# Altium footprint library MyPcbLib.PcbLib: 657 footprints (part 11 of 42)
Each footprint in its own frame and in the unit in brackets; x right, y up, seen from the top. Pads: shape width x height; smd on the part's side, far side on the other; paste and mask are expansions set on the pad; w line width, h text height; cw(c..) or ccw(c..) is an arc to the next point about the centre after c.
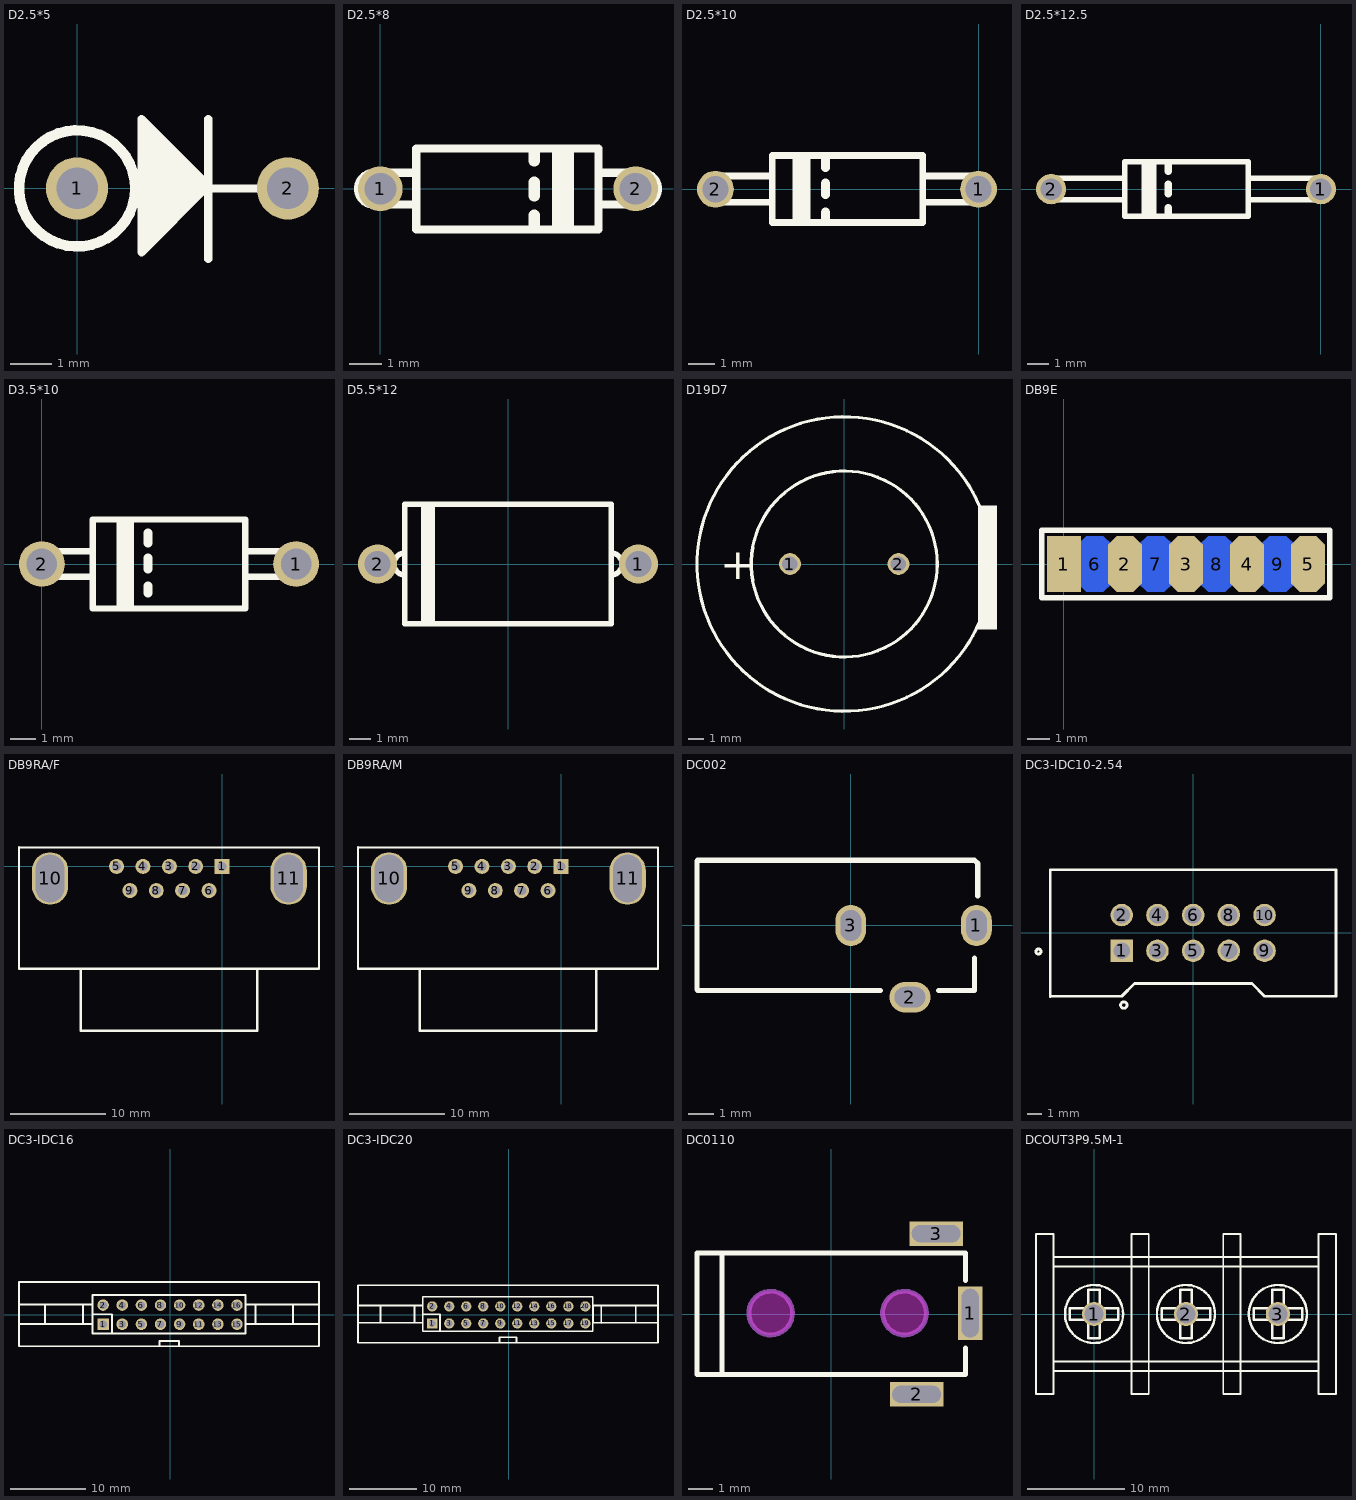
[diagram p10: the footprints below, top view; thin cyan lines are the x and y axes]

## D2.5*5 [mm]
pads (2):
  round 1.5 / inner round 1.5 / far side round 2 hole 1: 1(0,0) 2(5.08,0)
Top Overlay:
  circle w0.254: c0,0 r1.4
  lines w0.1: 1.553,-1.4 1.694,-1.4 ; 1.553,-1.3 1.794,-1.3 ; 1.553,-1.2 1.894,-1.2 ; 1.553,-1.1 1.994,-1.1 ; 1.553,-1 2.094,-1 ; 1.553,-0.9 2.194,-0.9 ; 1.553,-0.8 2.294,-0.8 ; 1.553,-0.7 2.394,-0.7 ; 1.553,-0.6 2.494,-0.6 ; 1.553,-0.5 2.594,-0.5 ; 1.553,-0.4 2.694,-0.4 ; 1.553,-0.3 2.794,-0.3 ; 1.553,-0.2 2.894,-0.2 ; 1.553,-0.1 2.994,-0.1 ; 1.553,0 3.094,0 ; 1.553,0.1 3.126,0.1 ; 1.553,0.2 3.026,0.2 ; 1.553,0.3 2.926,0.3 ; 1.553,0.4 2.826,0.4 ; 1.553,0.5 2.726,0.5 ; 1.553,0.6 2.626,0.6 ; 1.553,0.7 2.526,0.7 ; 1.553,0.8 2.426,0.8 ; 1.553,0.9 2.326,0.9 ; 1.553,1 2.226,1 ; 1.553,1.1 2.126,1.1 ; 1.553,1.2 2.026,1.2 ; 1.553,1.3 1.926,1.3 ; 1.553,1.4 1.826,1.4 ; 1.553,1.5 1.726,1.5 ; 1.572,-1.522 1.572,1.655 ; 1.672,-1.422 1.672,1.555 ; 1.772,-1.322 1.772,1.455 ; 1.872,-1.222 1.872,1.355 ; 1.972,-1.122 1.972,1.255 ; 2.072,-1.022 2.072,1.155 ; 2.172,-0.922 2.172,1.055 ; 2.272,-0.822 2.272,0.955 ; 2.372,-0.722 2.372,0.855 ; 2.472,-0.622 2.472,0.755 ; 2.572,-0.522 2.572,0.655 ; 2.672,-0.422 2.672,0.555 ; 2.772,-0.322 2.772,0.455 ; 2.872,-0.222 2.872,0.355 ; 2.972,-0.122 2.972,0.255 ; 3.072,-0.022 3.072,0.155 ; 1.553,-1.541 1.553,1.673 3.16,0.066 1.553,-1.541
  lines w0.2: 3.16,-1.702 3.16,1.673 ; 3.272,0 5.08,0 ; 1.553,-1.541 3.16,0.066 1.553,1.673 1.553,-1.541
  lines w1: 2.1,-0.327 2.1,0.423

## D2.5*8 [mm]
pads (2):
  round 1.4 / inner round 1.4 / far side round 2 hole 1: 1(0,0) 2(8,0)
Top Overlay:
  lines w0.25: 5.503,1.142 5.503,-1.158 5.943,-1.158 5.943,1.142 ; 5.633,-1.058 5.633,1.122 ; 5.803,-1.128 5.803,1.202
  lines w0.254: 1.093,-0.5 -0.2,-0.5 cw(c-0.2,0) -0.2,0.5 1.125,0.5 ; 6.84,-0.5 8.2,-0.5 ccw(c8.2,0) 8.2,0.5 6.84,0.5 ; 1.125,-1.278 6.84,-1.278 6.84,1.262 1.125,1.262 1.125,-1.278
  lines w0.35: 4.822,-1.228 4.822,-0.828 ; 4.822,-0.228 4.822,0.202 ; 4.822,0.872 4.822,1.152

## D2.5*10 [mm]
pads (2):
  round 1.4 / inner round 1.4 / far side round 2 hole 1: 1(0,0) 2(-10,0)
Top Overlay:
  lines w0.25: -6.943,-1.142 -6.943,1.158 -6.503,1.158 -6.503,-1.142 ; -6.803,-1.202 -6.803,1.128 ; -6.632,-1.122 -6.632,1.058
  lines w0.254: -7.84,-0.5 -10,-0.5 cw(c-10,0) -10,0.5 -7.84,0.5 ; -2.125,-0.5 0,-0.5 ccw(c0,0) 0,0.5 -2.093,0.5 ; -7.84,-1.262 -7.84,1.278 -2.125,1.278 -2.125,-1.262 -7.84,-1.262
  lines w0.35: -5.822,-1.152 -5.822,-0.872 ; -5.822,-0.202 -5.822,0.228 ; -5.822,0.828 -5.822,1.228

## D2.5*12.5 [mm]
pads (2):
  round 1.4 / inner round 1.4 / far side round 2 hole 1: 1(0,0) 2(-12.5,0)
Top Overlay:
  lines w0.25: -8.193,-1.142 -8.193,1.158 -7.753,1.158 -7.753,-1.142 ; -8.053,-1.202 -8.053,1.128 ; -7.883,-1.122 -7.883,1.058
  lines w0.254: -9.09,-0.5 -12.5,-0.5 cw(c-12.5,0) -12.5,0.5 -9.09,0.5 ; -3.375,-0.5 0,-0.5 ccw(c0,0) 0,0.5 -3.343,0.5 ; -9.09,-1.262 -9.09,1.278 -3.375,1.278 -3.375,-1.262 -9.09,-1.262
  lines w0.35: -7.073,-1.152 -7.073,-0.872 ; -7.073,-0.202 -7.073,0.228 ; -7.073,0.828 -7.073,1.228

## D3.5*10 [mm]
pads (2):
  round 1.8 hole 1.2: 1(10,0) 2(0,0)
Top Overlay:
  rectangle: 3,-1.75 3.625,1.75
  lines w0.25: 3.057,-1.693 3.057,-0.875 ; 3.057,-1.142 3.057,1.158 ; 3.057,1.693 3.057,1.158 ; 3.197,-1.202 3.197,1.128 ; 3.367,-1.122 3.367,1.058 ; 3.497,-1.142 3.497,1.158 3.057,1.158
  lines w0.254: 2,-0.5 0,-0.5 cw(c0,0) 0,0.5 2,0.5 ; 8,-0.5 10,-0.5 ccw(c10,0) 10,0.5 8,0.5 ; 2,-1.75 2,1.75 8,1.75 8,-1.75 2,-1.75
  lines w0.35: 4.177,-1.152 4.177,-0.872 ; 4.177,-0.202 4.177,0.228 ; 4.177,0.828 4.177,1.228

## D5.5*12 [mm]
pads (2):
  round 1.8 hole 1.2: 1(6,0) 2(-6,0)
Top Overlay:
  rectangle: -4.013,-2.75 -3.353,2.743
  lines w0.254: -4.75,-0.5 cw(c-4.75,0) -4.75,0.5 ; 4.75,-0.5 ccw(c4.75,0) 4.75,0.5 ; -4.75,-2.75 4.75,-2.75 4.75,2.75 -4.75,2.75 -4.75,-2.75

## D19D7 [mm]
pads (2):
  round 1.4 / inner round 1.4 / far side round 2 hole 1: 1(-3.5,0) 2(3.5,0)
Top Overlay:
  circle w0.203: c0,0 r6
  circle w0.203: c0,0 r9.5
  rectangle: 8.636,-4.216 9.855,3.759
  text "+" at -8,-1 h2

## DB9E [mil]
pads (9):
  rect 60x100 smd: 1(0,0)
  oct 60x100 smd: 2(109,0) 3(218,0) 4(327,0) 5(436,0)
  oct 60x100 smd far side: 6(55,0) 7(164,0) 8(273,0) 9(382,0)
Top Overlay:
  lines w10: -40,-60 475,-60 475,60 -40,60 -40,-60

## DB9RA/F [mil]
pads (11):
  rect 62x62 hole 38: 1(0,0)
  round 62 hole 38: 2(-109,0) 3(-218,0) 4(-327,0) 5(-436,0) 6(-54,-100) 7(-163,-100) 8(-272,-100) 9(-381,-100)
  oval 150x216.54 hole 118.11 slot 196.85 at 90 deg: 10(-711,-50) 11(275,-50)
Top Overlay:
  lines w8: -839.54,78.74 400.61,78.74 400.61,-423.23
  lines w10: -839.54,78.74 -839.54,-423.23 400.61,-423.23 ; -583.64,-425 -583.64,-679.13 144.71,-679.13 144.71,-425
3D body: height 126.51, standoff -507.87, extent -829.27,-658.6 387.27,54

## DB9RA/M [mil]
pads (11):
  rect 62x62 hole 38: 1(0,0)
  round 62 hole 38: 2(-109,0) 3(-218,0) 4(-327,0) 5(-436,0) 6(-54,-100) 7(-163,-100) 8(-272,-100) 9(-381,-100)
  oval 150x216.54 hole 118.11 slot 196.85 at 90 deg: 10(-711,-50) 11(275,-50)
Top Overlay:
  lines w8: -839.54,78.74 400.61,78.74 400.61,-423.23
  lines w10: -839.54,78.74 -839.54,-423.23 400.61,-423.23 ; -583.64,-425 -583.64,-679.13 144.71,-679.13 144.71,-425
3D body: height 492.13, standoff -142.26, extent -828.69,-651.41 387.84,57.25

## DC002 [mm]
pads (3):
  oval 1.2x1.6 hole 0.8 slot 1.2 at 90 deg: 1(4.9,0) 3(0,0)
  oval 1.6x1.2 hole 0.8 slot 1.2 at 0 deg: 2(2.306,-2.8)
Top Overlay:
  lines w0.203: -6,-2.5 -6,2.5 ; -5.969,-2.54 1.143,-2.54 ; -5.969,2.54 4.826,2.54 4.953,2.413 4.953,1.651 4.953,1.143 ; 3.429,-2.54 4.826,-2.54 4.826,-1.27
3D body: height 7.5, standoff 0, extent -6.071,-2.525 4.929,2.475

## DC3-IDC10-2.54 [mm]
pads (10):
  rect 1.6x1.6 hole 1.2: 1(-5.08,-1.27)
  round 1.6 hole 1.2: 2(-5.08,1.27) 3(-2.54,-1.27) 4(-2.54,1.27) 5(0,-1.27) 6(0,1.27) 7(2.54,-1.27) 8(2.54,1.27) 9(5.08,-1.27) 10(5.08,1.27)
Top Overlay:
  circle w0.203: c-10.998,-1.321 r0.18
  circle w0.203: c-4.928,-5.131 r0.23
  lines w0.203: -10.16,-4.521 -10.16,4.47 ; -10.15,-4.5 -5.075,-4.5 -4.182,-3.607 4.182,-3.607 5.075,-4.5 10.15,-4.5 ; -10.15,4.5 10.15,4.5 ; 10.16,-4.496 10.16,4.47
3D body: height 9.3, standoff -3.1, extent -10.099,-4.273 10.201,4.827

## DC3-IDC16 [mil]
pads (16):
  rect 60x60 hole 40: 1(-350,-50)
  round 60 hole 40: 2(-350,50) 3(-250,-50) 4(-250,50) 5(-150,-50) 6(-150,50) 7(-50,-50) 8(-50,50) 9(50,-50) 10(50,50) 11(150,-50) 12(150,50) 13(250,-50) 14(250,50) 15(350,-50) 16(350,50)
Top Overlay:
  lines w10: -790,54 -406,54 ; -789,-48 -408,-48 ; -789,140 -789,171 779,171 779,-165 -80,-165 46,-165 46,-137 -56,-137 -56,-165 -789,-165 -789,172 ; -653,-48 -653,50 ; -455,-48 -455,53 ; -406,62 -406,103 395,103 395,-99 -406,-99 -406,98 ; -402,2 -304,2 -304,-97 ; 397,54 779,54 ; 400,-48 779,-48 ; 446,-44 446,53 ; 643,-48 643,53

## DC3-IDC20 [mil]
pads (20):
  rect 60x60 hole 40: 1(-450,-50)
  round 60 hole 40: 2(-450,50) 3(-350,-50) 4(-350,50) 5(-250,-50) 6(-250,50) 7(-150,-50) 8(-150,50) 9(-50,-50) 10(-50,50) 11(50,-50) 12(50,50) 13(150,-50) 14(150,50) 15(250,-50) 16(250,50) 17(350,-50) 18(350,50) 19(450,-50) 20(450,50)
Top Overlay:
  lines w10: -885,-46 -508,-46 ; -883,56 -509,56 ; -754,-42 -754,52 ; -554,-41 -554,55 ; -504,4 -404,4 -404,-93 ; -54,-161 -54,-131 46,-131 46,-161 ; 494,34 494,106 -506,106 -506,-96 494,-96 494,103 ; 544,-47 544,53 ; 746,-45 746,55 ; 874,-46 497,-46 497,56 877,56 877,174 -886,174 -886,-163 877,-163 877,144

## DC0110 [mm]
pads (3):
  rect 1x2.2 hole 0.7 slot 2 at 90 deg: 1(5.714,0.036)
  rect 2.2x1 hole 0.7 slot 2 at 0 deg: 2(3.514,-3.3) 3(4.314,3.3)
Top Overlay:
  lines w0.203: -5.512,2.511 -5.512,-2.489 5.488,-2.489 ; -5.488,2.515 5.512,2.515 ; -4.482,-2.489 -4.482,2.511 ; 5.512,-2.485 5.512,-1.397 ; 5.512,1.375 5.512,2.464
Keep-Out Layer:
  board cut-out: 2.106,0.036 2.137,-0.199 2.227,-0.418 2.372,-0.606 2.56,-0.75 2.779,-0.841 3.014,-0.872 3.249,-0.841 3.467,-0.75 3.655,-0.606 3.8,-0.418 3.89,-0.199 3.921,0.036 3.89,0.271 3.8,0.49 3.655,0.678 3.467,0.822 3.249,0.913 3.014,0.944 2.779,0.913 2.56,0.822 2.372,0.678 2.227,0.49 2.137,0.271
  board cut-out: -3.394,0.036 -3.363,-0.199 -3.273,-0.418 -3.128,-0.606 -2.94,-0.75 -2.721,-0.841 -2.486,-0.872 -2.251,-0.841 -2.033,-0.75 -1.845,-0.606 -1.7,-0.418 -1.61,-0.199 -1.579,0.036 -1.61,0.271 -1.7,0.49 -1.845,0.678 -2.033,0.822 -2.251,0.913 -2.486,0.944 -2.721,0.913 -2.94,0.822 -3.128,0.678 -3.273,0.49 -3.363,0.271
Mechanical 1:
  circle w0.203: c3.014,0.036 r0.9
  circle w0.203: c-2.486,0.036 r0.9

## DCOUT3P9.5M-1 [mm]
pads (3):
  round 2.5 / inner round 2.5 / far side round 5 hole 2: 1(0,0) 2(9.5,0) 3(19,0)
Top Overlay:
  circle w0.25: c19,0 r3
  circle w0.25: c9.5,0 r3
  circle w0.25: c0,0 r3
  lines w0.2: -4.2,-5.9 23.2,-5.9 ; -4.2,-4.9 23.2,-4.9 ; -4.2,4.9 23.2,4.9 ; -4.2,5.9 23.2,5.9 ; -6,-8.25 -4.2,-8.25 -4.2,8.25 -6,8.25 -6,-8.25 ; 3.85,-8.25 5.65,-8.25 5.65,8.25 3.85,8.25 3.85,-8.25 ; 13.35,-8.25 15.15,-8.25 15.15,8.25 13.35,8.25 13.35,-8.25 ; 23.2,-8.25 25,-8.25 25,8.25 23.2,8.25 23.2,-8.25
  lines w0.25: -2.5,-0.6 -0.6,-0.6 -0.6,-2.5 0.6,-2.5 0.6,-0.6 2.5,-0.6 2.5,0.6 0.6,0.6 0.6,2.5 -0.6,2.5 -0.6,0.6 -2.5,0.6 -2.5,-0.6 ; 7,-0.6 8.9,-0.6 8.9,-2.5 10.1,-2.5 10.1,-0.6 12,-0.6 12,0.6 10.1,0.6 10.1,2.5 8.9,2.5 8.9,0.6 7,0.6 7,-0.6 ; 16.5,-0.6 18.4,-0.6 18.4,-2.5 19.6,-2.5 19.6,-0.6 21.5,-0.6 21.5,0.6 19.6,0.6 19.6,2.5 18.4,2.5 18.4,0.6 16.5,0.6 16.5,-0.6